# Altium footprint library IC.PCBLIB: 359 footprints (part 4 of 23)
Each footprint in its own frame and in the unit in brackets; x right, y up, seen from the top. Pads: shape width x height; smd on the part's side, far side on the other; paste and mask are expansions set on the pad; w line width, h text height; cw(c..) or ccw(c..) is an arc to the next point about the centre after c.
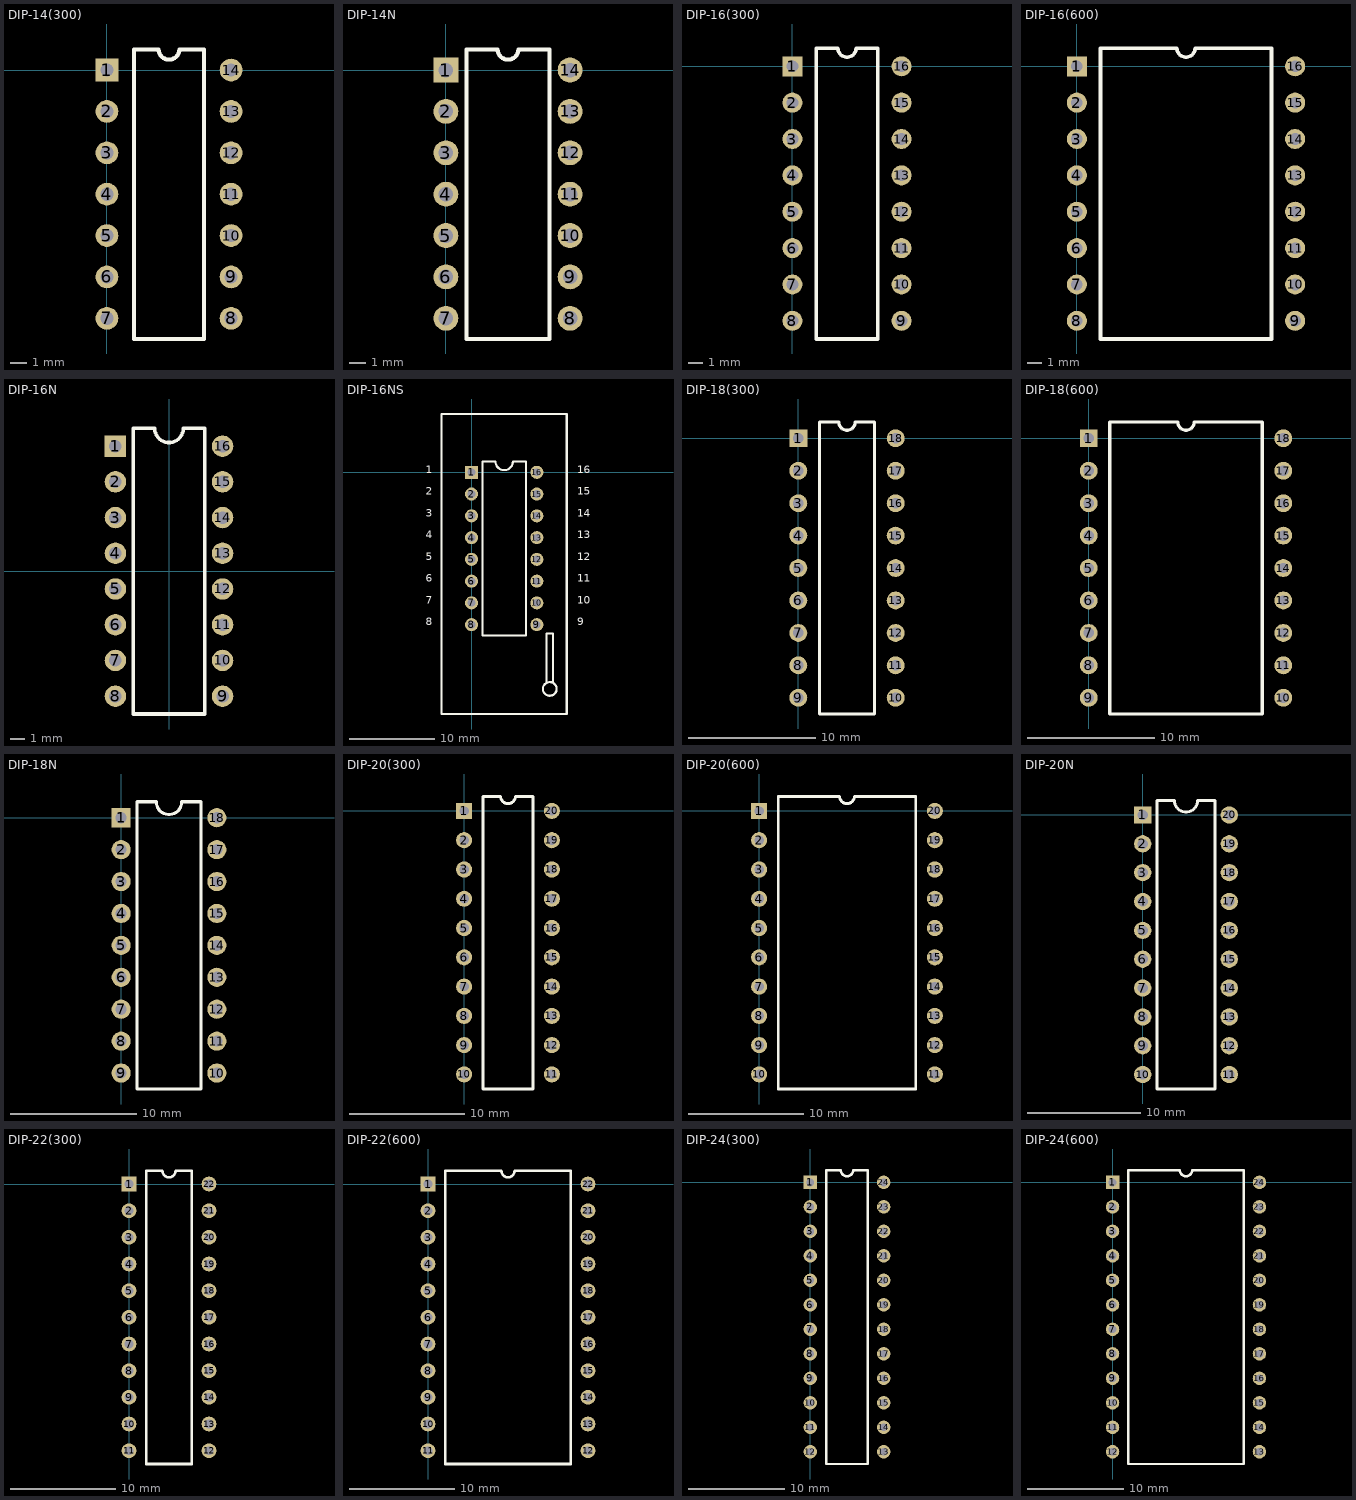
[diagram p3: the footprints below, top view; thin cyan lines are the x and y axes]

## DIP-14(300) [mil]
pads (14):
  rect 55x55 hole 32: 1(0,0)
  round 55 hole 32: 2(0,-100) 3(0,-200) 4(0,-300) 5(0,-400) 6(0,-500) 7(0,-600) 8(300,-600) 9(300,-500) 10(300,-400) 11(300,-300) 12(300,-200) 13(300,-100) 14(300,0)
TopOverlay:
  lines w10: 65,-650 235,-650 235,50 175,50 cw(c150,50) 125,50 65,50 65,-650

## DIP-14N [mil]
pads (14):
  rect 60x60 hole 35: 1(0,0)
  round 60 hole 35: 2(0,-100) 3(0,-200) 4(0,-300) 5(0,-400) 6(0,-500) 7(0,-600) 8(300,-600) 9(300,-500) 10(300,-400) 11(300,-300) 12(300,-200) 13(300,-100) 14(300,0)
TopOverlay:
  lines w10: 50,-650 250,-650 250,50 175,50 cw(c150,50) 125,50 50,50 50,-650

## DIP-16(300) [mil]
pads (16):
  rect 55x55 hole 32: 1(0,0)
  round 55 hole 32: 2(0,-100) 3(0,-200) 4(0,-300) 5(0,-400) 6(0,-500) 7(0,-600) 8(0,-700) 9(300,-700) 10(300,-600) 11(300,-500) 12(300,-400) 13(300,-300) 14(300,-200) 15(300,-100) 16(300,0)
TopOverlay:
  lines w10: 65,-750 235,-750 235,50 175,50 cw(c150,50) 125,50 65,50 65,-750

## DIP-16(600) [mil]
pads (16):
  rect 55x55 hole 32: 1(0,0)
  round 55 hole 32: 2(0,-100) 3(0,-200) 4(0,-300) 5(0,-400) 6(0,-500) 7(0,-600) 8(0,-700) 9(600,-700) 10(600,-600) 11(600,-500) 12(600,-400) 13(600,-300) 14(600,-200) 15(600,-100) 16(600,0)
TopOverlay:
  lines w10: 65,-750 65,50 275,50 ccw(c300,50) 325,50 535,50 535,-750 65,-750

## DIP-16N [mil]
pads (16):
  rect 60x60 hole 35: 1(-150,350)
  round 60 hole 35: 2(-150,250) 3(-150,150) 4(-150,50) 5(-150,-50) 6(-150,-150) 7(-150,-250) 8(-150,-350) 9(150,-350) 10(150,-250) 11(150,-150) 12(150,-50) 13(150,50) 14(150,150) 15(150,250) 16(150,350)
TopOverlay:
  lines w10: -100,-400 100,-400 100,400 40,400 cw(c0,400) -40,400 -100,400 -100,-400

## DIP-16NS [mil]
pads (16):
  rect 60x60 hole 35: 1(0,0)
  round 60 hole 35: 2(0,-100) 3(0,-200) 4(0,-300) 5(0,-400) 6(0,-500) 7(0,-600) 8(0,-700) 9(300,-700) 10(300,-600) 11(300,-500) 12(300,-400) 13(300,-300) 14(300,-200) 15(300,-100) 16(300,0)
TopOverlay:
  circle w10: c359.38,-995 r31.5
  lines w10: 345,-965 345,-740 373.77,-740 373.77,-965 ; -137.4,-1110.24 -137.4,267.72 437.4,267.72 437.4,-1110.24 -137.4,-1110.24 ; 50,-750 50,50 110,50 ccw(c150,50) 190,50 250,50 250,-750 50,-750
  text "9" at 485,-715 h60
  text "10" at 485,-615 h60
  text "11" at 485,-515 h60
  text "12" at 485,-415 h60
  text "13" at 485,-315 h60
  text "14" at 485,-215 h60
  text "15" at 485,-115 h60
  text "7" at -210,-615 h60
  text "6" at -210,-515 h60
  text "5" at -210,-415 h60
  text "4" at -210,-315 h60
  text "3" at -210,-215 h60
  text "2" at -210,-115 h60
  text "1" at -210,-15 h60
  text "8" at -210,-715 h60
  text "16" at 485,-15 h60

## DIP-18(300) [mil]
pads (18):
  rect 55x55 hole 32: 1(0,0)
  round 55 hole 32: 2(0,-100) 3(0,-200) 4(0,-300) 5(0,-400) 6(0,-500) 7(0,-600) 8(0,-700) 9(0,-800) 10(300,-800) 11(300,-700) 12(300,-600) 13(300,-500) 14(300,-400) 15(300,-300) 16(300,-200) 17(300,-100) 18(300,0)
TopOverlay:
  lines w10: 65,-850 235,-850 235,50 175,50 cw(c150,50) 125,50 65,50 65,-850

## DIP-18(600) [mil]
pads (18):
  rect 55x55 hole 32: 1(0,0)
  round 55 hole 32: 2(0,-100) 3(0,-200) 4(0,-300) 5(0,-400) 6(0,-500) 7(0,-600) 8(0,-700) 9(0,-800) 10(600,-800) 11(600,-700) 12(600,-600) 13(600,-500) 14(600,-400) 15(600,-300) 16(600,-200) 17(600,-100) 18(600,0)
TopOverlay:
  lines w10: 65,-850 65,50 275,50 ccw(c300,50) 325,50 535,50 535,-850 65,-850

## DIP-18N [mil]
pads (18):
  rect 60x60 hole 35: 1(0,0)
  round 60 hole 35: 2(0,-100) 3(0,-200) 4(0,-300) 5(0,-400) 6(0,-500) 7(0,-600) 8(0,-700) 9(0,-800) 10(300,-800) 11(300,-700) 12(300,-600) 13(300,-500) 14(300,-400) 15(300,-300) 16(300,-200) 17(300,-100) 18(300,0)
TopOverlay:
  lines w10: 50,-850 250,-850 250,50 190,50 cw(c150,50) 110,50 50,50 50,-850

## DIP-20(300) [mil]
pads (20):
  rect 55x55 hole 32: 1(0,0)
  round 55 hole 32: 2(0,-100) 3(0,-200) 4(0,-300) 5(0,-400) 6(0,-500) 7(0,-600) 8(0,-700) 9(0,-800) 10(0,-900) 11(300,-900) 12(300,-800) 13(300,-700) 14(300,-600) 15(300,-500) 16(300,-400) 17(300,-300) 18(300,-200) 19(300,-100) 20(300,0)
TopOverlay:
  lines w10: 65,-950 65,50 125,50 ccw(c150,50) 175,50 235,50 235,-950 65,-950

## DIP-20(600) [mil]
pads (20):
  rect 55x55 hole 32: 1(0,0)
  round 55 hole 32: 2(0,-100) 3(0,-200) 4(0,-300) 5(0,-400) 6(0,-500) 7(0,-600) 8(0,-700) 9(0,-800) 10(0,-900) 11(600,-900) 12(600,-800) 13(600,-700) 14(600,-600) 15(600,-500) 16(600,-400) 17(600,-300) 18(600,-200) 19(600,-100) 20(600,0)
TopOverlay:
  lines w10: 65,-950 65,50 275,50 ccw(c300,50) 325,50 535,50 535,-950 65,-950

## DIP-20N [mil]
pads (20):
  rect 60x60 hole 35: 1(0,0)
  round 60 hole 35: 2(0,-100) 3(0,-200) 4(0,-300) 5(0,-400) 6(0,-500) 7(0,-600) 8(0,-700) 9(0,-800) 10(0,-900) 11(300,-900) 12(300,-800) 13(300,-700) 14(300,-600) 15(300,-500) 16(300,-400) 17(300,-300) 18(300,-200) 19(300,-100) 20(300,0)
TopOverlay:
  lines w10: 50,-950 250,-950 250,50 190,50 cw(c150,50) 110,50 50,50 50,-950

## DIP-22(300) [mil]
pads (22):
  rect 55x55 hole 32: 1(0,0)
  round 55 hole 32: 2(0,-100) 3(0,-200) 4(0,-300) 5(0,-400) 6(0,-500) 7(0,-600) 8(0,-700) 9(0,-800) 10(0,-900) 11(0,-1000) 12(300,-1000) 13(300,-900) 14(300,-800) 15(300,-700) 16(300,-600) 17(300,-500) 18(300,-400) 19(300,-300) 20(300,-200) 21(300,-100) 22(300,0)
TopOverlay:
  lines w10: 65,-1050 65,50 125,50 ccw(c150,50) 175,50 235,50 235,-1050 65,-1050

## DIP-22(600) [mil]
pads (22):
  rect 55x55 hole 32: 1(0,0)
  round 55 hole 32: 2(0,-100) 3(0,-200) 4(0,-300) 5(0,-400) 6(0,-500) 7(0,-600) 8(0,-700) 9(0,-800) 10(0,-900) 11(0,-1000) 12(600,-1000) 13(600,-900) 14(600,-800) 15(600,-700) 16(600,-600) 17(600,-500) 18(600,-400) 19(600,-300) 20(600,-200) 21(600,-100) 22(600,0)
TopOverlay:
  lines w10: 65,-1050 65,50 275,50 ccw(c300,50) 325,50 535,50 535,-1050 65,-1050

## DIP-24(300) [mil]
pads (24):
  rect 55x55 hole 32: 1(0,0)
  round 55 hole 32: 2(0,-100) 3(0,-200) 4(0,-300) 5(0,-400) 6(0,-500) 7(0,-600) 8(0,-700) 9(0,-800) 10(0,-900) 11(0,-1000) 12(0,-1100) 13(300,-1100) 14(300,-1000) 15(300,-900) 16(300,-800) 17(300,-700) 18(300,-600) 19(300,-500) 20(300,-400) 21(300,-300) 22(300,-200) 23(300,-100) 24(300,0)
TopOverlay:
  lines w10: 65,-1150 65,50 125,50 ccw(c150,50) 175,50 235,50 235,-1150 65,-1150

## DIP-24(600) [mil]
pads (24):
  rect 55x55 hole 32: 1(0,0)
  round 55 hole 32: 2(0,-100) 3(0,-200) 4(0,-300) 5(0,-400) 6(0,-500) 7(0,-600) 8(0,-700) 9(0,-800) 10(0,-900) 11(0,-1000) 12(0,-1100) 13(600,-1100) 14(600,-1000) 15(600,-900) 16(600,-800) 17(600,-700) 18(600,-600) 19(600,-500) 20(600,-400) 21(600,-300) 22(600,-200) 23(600,-100) 24(600,0)
TopOverlay:
  lines w10: 65,-1150 65,50 275,50 ccw(c300,50) 325,50 535,50 535,-1150 65,-1150